# Altium footprint library Derogarian_Library.PcbLib: 99 footprints (part 7 of 7)
Each footprint in its own frame and in the unit in brackets; x right, y up, seen from the top. Pads: shape width x height; smd on the part's side, far side on the other; paste and mask are expansions set on the pad; w line width, h text height; cw(c..) or ccw(c..) is an arc to the next point about the centre after c.
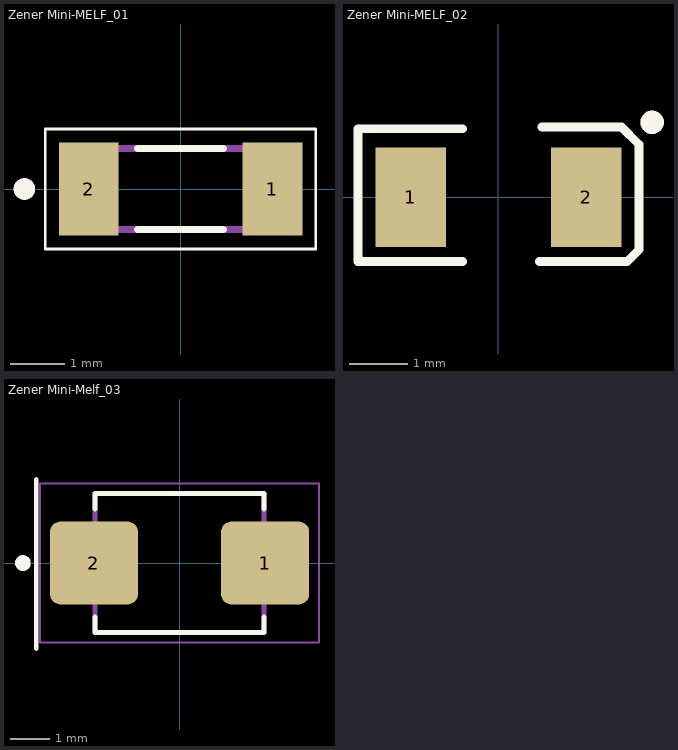
[diagram p6: the footprints below, top view; thin cyan lines are the x and y axes]

## Zener Mini-MELF_01 [mm] "Mini-MELF"
pads (2):
  rect 1.11x1.73 smd: 1(1.705,0) 2(-1.705,0)
Top Overlay:
  circle w0.2: c-2.9,0 r0.1
  lines w0.05: -2.51,-1.115 2.51,-1.115 2.51,1.115 -2.51,1.115 -2.51,-1.115
  lines w0.127: -0.8,-0.75 0.8,-0.75 ; -0.8,0.75 0.8,0.75
Mechanical 13:
  circle w0.2: c-2.9,0 r0.1
  lines w0.127: -1.75,-0.75 -1.75,0.75 1.75,0.75 1.75,-0.75 -1.75,-0.75
3D body "BZT55B22 L0G.STEP": height 1.6, standoff 0, extent -1.725,-0.775 1.775,0.825

## Zener Mini-MELF_02 [mm] "Mini-MELF"
pads (2):
  rect 1.2x1.7 smd: 1(-1.5,0) 2(1.5,0)
Top Overlay:
  circle w0.2: c2.625,1.278 r0.1
  lines w0.15: -0.611,-1.1 -2.4,-1.1 -2.4,1.17 -0.611,1.17 ; 0.7,-1.1 2.2,-1.1 2.4,-0.9 2.4,-0.5 2.4,0.9 2.1,1.2 0.74,1.2
Mechanical 13:
  circle w0.2: c2.625,1.278 r0.1
3D body "User Library-MiniMelf-2.STEP": height 1.6, standoff 0, extent -1.82,-0.8 1.88,0.8

## Zener Mini-Melf_03 [mm]
pads (2):
  rrect25% 2.25x2.12 smd: 1(2.185,0) 2(-2.185,0)
Top Overlay:
  circle w0.2: c-4,0 r0.1
  lines w0.127: -3.66,-2.185 -3.66,2.135 ; -2.16,-1.374 -2.16,-1.78 2.16,-1.78 2.16,-1.374 ; -2.16,1.374 -2.16,1.78 2.16,1.78 2.16,1.374
Mechanical 13:
  lines w0.127: -2.16,-1.78 -2.16,1.78 2.16,1.78 2.16,-1.78 -2.16,-1.78
Mechanical 15:
  lines w0.05: -3.56,-2.03 3.56,-2.03 3.56,2.03 -3.56,2.03 -3.56,-2.03
3D body "step_temp.STEP": height 2.49, standoff 0.02, extent -2.72,-1.78 2.72,1.78